# Altium integrated library Backend.IntLib: 80 symbols
Pins are listed as number, name and electrical type; pins without a type are passive.

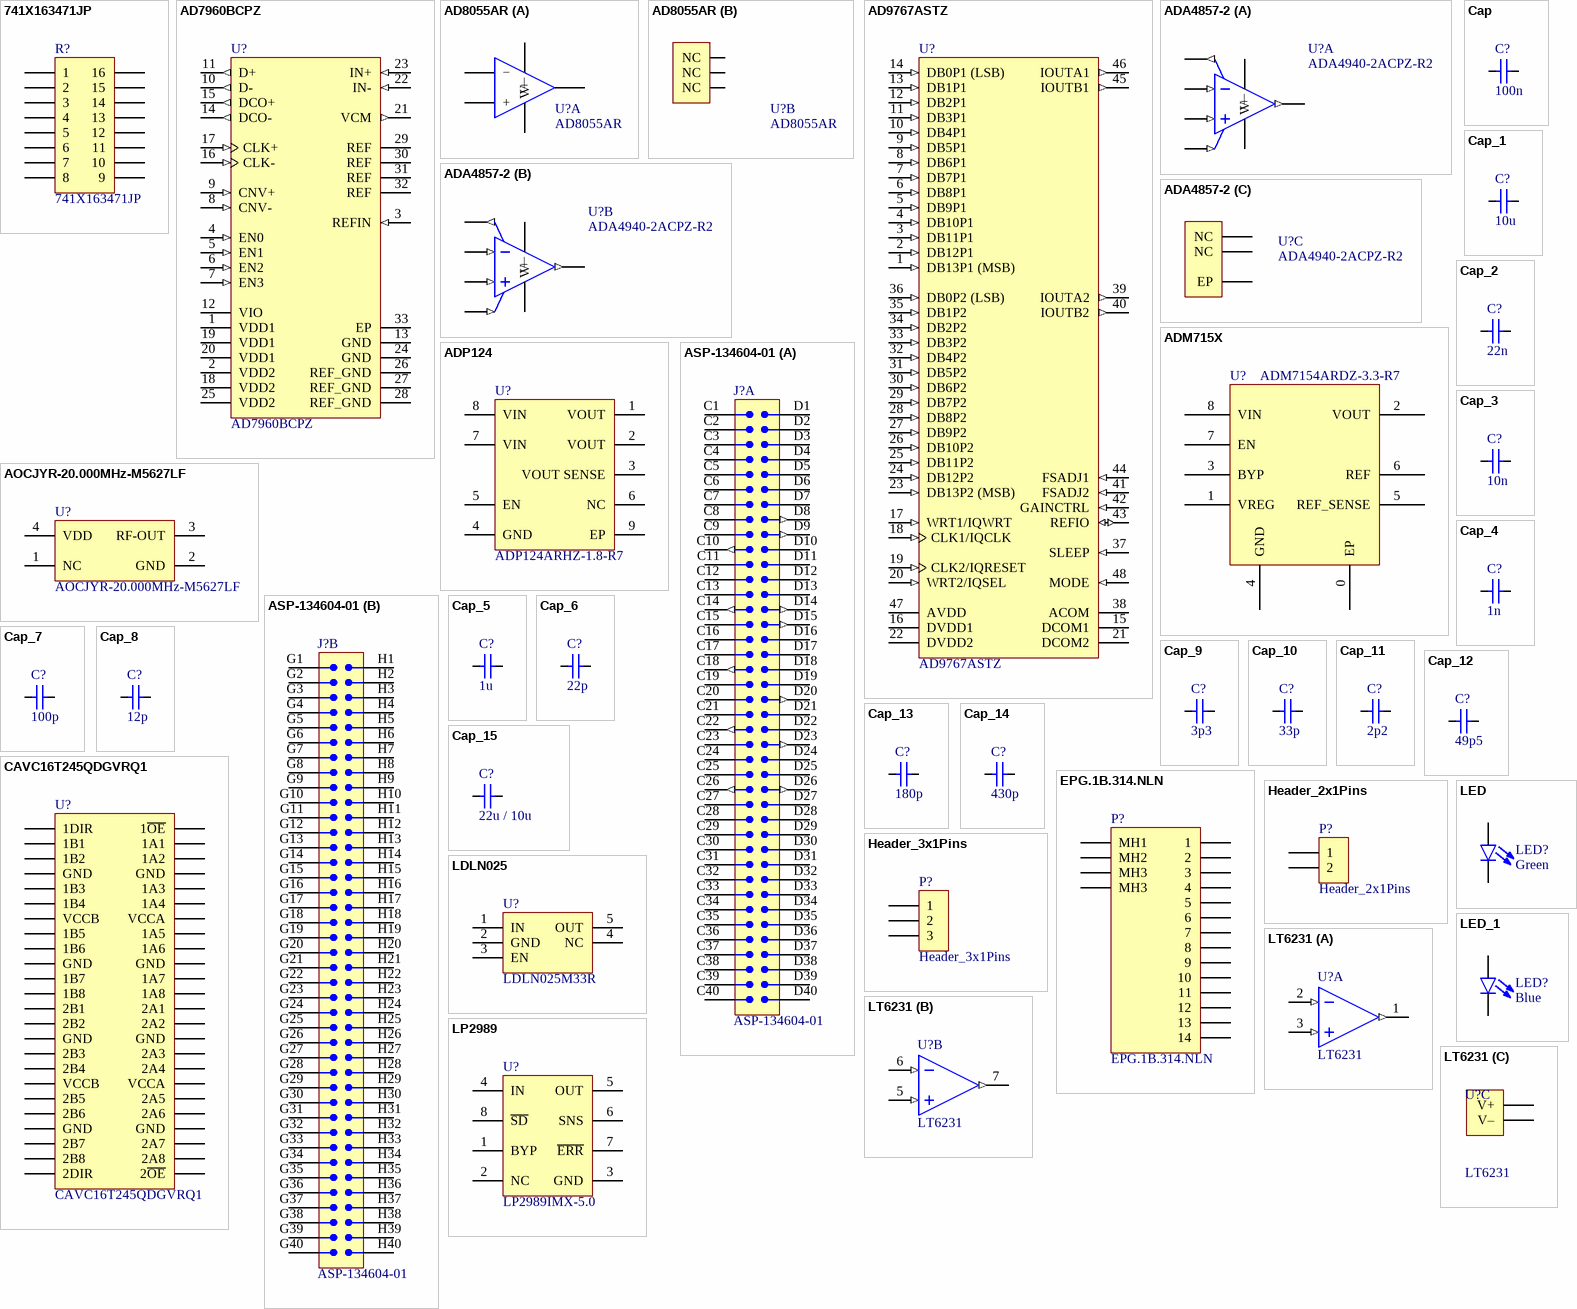
[diagram p0: symbols 741X163471JP to LT6231]

## 741X163471JP
designator R?
470 Ohm +/-5% 63mW Power Per Element Isolated 8 Resistor Network/Array +/-200ppm/C 1506, Convex, Long Side Terminals; Manufacturer_Name: CTS; Geometry.Height: 0.55mm; Mouser Part Number: *; Mouser Price/Stock: *; Manufacturer_Part_Number: 741X163471JP; Datasheet Link: https://www.ctscorp.com/wp-content/uploads/74x.pdf
footprint 741X163471JP
pins: 1, 2, 3, 4, 5, 6, 7, 8, 9, 10, 11, 12, 13, 14, 15, 16

## AD7960BCPZ
designator U?
Single 18-Bit PulSAR Differential Analog-to-Digital Converter with Serial LVDS Interface, 5 MSPS, -40 to 85 degC, CP-32-7, RoHS, Tray; Manufacturer: Analog Devices; Full Power BW: 28 MHz; # of Channels: 1; Throughput Rate: 5 MSPS; Dynamic Range: 100 dB; Resolution: 18 Bits; ComponentLink1Description: Manufacturer URL; ComponentLink3Description: Package Specification; PartNumber: AD7960BCPZ; ComponentLink1URL: http://www.analog.com/en/index.html; ComponentLink2URL: http://www.analog.com/static/imported-files/data_sheets/AD7960.pdf; ComponentLink3URL: http://www.analog.com/static/imported-files/packages/CP_32_7.pdf; RoHS: TRUE; DatasheetVersion: Rev. A; ADC_Sample_Rate: 5 MSPS; Mounting Technology: Surface Mount; Packing: Tray; PackageReference: CP-32-7; Temperature Range: -40 to 85 degC; ComponentLink2Description: Datasheet; PackageDescription: 32-Pin Lead Frame Chip Scale Package, Body 5 x 5 mm, Pitch 0.5 mm; PackageVersion: 112408-A
footprint ADI-CP-32-7_M (QFN, 32-Leads, Body 5x5mm, Pitch 0.5mm, Thermal Pad 3.1x3.1mm, IPC Low Density)
footprint ADI-CP-32-7_N (QFN, 32-Leads, Body 5x5mm, Pitch 0.5mm, Thermal Pad 3.1x3.1mm, IPC Medium Density)
footprint ADI-CP-32-7_L (QFN, 32-Leads, Body 5x5mm, Pitch 0.5mm, Thermal Pad 3.1x3.1mm, IPC High Density)
pins: 1 VDD1 (power) "Analog 5 V Supply. Decouple the 5 V supply with a 100 nF capacitor.", 2 VDD2 (power) "Analog 1.8 V Supply. Decouple this pin with a 100 nF capacitor.", 3 REFIN (in) "Prebuffer Reference Voltage.", 4 EN0 (in) "Enable.The logic levels of these pins set the operation of the device, as described in Table 9.", 5 EN1 (in) "Enable.The logic levels of these pins set the operation of the device, as described in Table 9.", 6 EN2 (in) "Enable.The logic levels of these pins set the operation of the device, as described in Table 9.", 7 EN3 (in) "Enable.The logic levels of these pins set the operation of the device, as described in Table 9.", 8 CNV- (in) "Convert Input. These pins act as the conversion control pin.", 9 CNV+ (in) "Convert Input. These pins act as the conversion control pin.", 10 D- (out) "LVDS Data Outputs. The conversion data is output serially on these pins.", 11 D+ (out) "LVDS Data Outputs. The conversion data is output serially on these pins.", 12 VIO (power) "Input/Output Interface Supply. Use a 1.8 V supply and decouple this pin with a 100 nF capacitor", 13 GND (power) "Ground.", 14 DCO- (out) "LVDS Buffered Clock Outputs.", 15 DCO+ (out) "LVDS Buffered Clock Outputs.", 16 CLK- (in) "LVDS Clock Inputs. This clock shifts out the conversion results on the falling edge of CLK+.", 17 CLK+ (in) "LVDS Clock Inputs. This clock shifts out the conversion results on the falling edge of CLK+.", 18 VDD2 (power) "Analog 1.8 V Supply. Decouple this pin with a 100 nF capacitor.", 19 VDD1 (power) "Analog 5 V Supply. Decouple the 5 V supply with a 100 nF capacitor.", 20 VDD1 (power) "Analog 5 V Supply. Decouple the 5 V supply with a 100 nF capacitor.", 21 VCM (out) "Common-Mode Output. When using any reference scheme, this pin produces one-half the voltage present on the REF pin, which can be useful for driving the common mode of the input amplifiers.", 22 IN- (in) "Differential Negative Analog Input. Referenced to and must be driven 180degC out of phase with IN+.", 23 IN+ (in) "Differential Positive Analog Input. Referenced to and must be driven 180degC out of phase with IN-.", 24 GND (power) "Ground.", 25 VDD2 (power) "Analog 1.8 V Supply. Decouple this pin with a 100 nF capacitor.", 26 REF_GND (power) "Reference Ground. Connect the capacitors on the REF pin between REF and REF_GND. Tie REF_GND to GND.", 27 REF_GND (power) "Reference Ground. Connect the capacitors on the REF pin between REF and REF_GND. Tie REF_GND to GND.", 28 REF_GND (power) "Reference Ground. Connect the capacitors on the REF pin between REF and REF_GND. Tie REF_GND to GND.", 29 REF (power) "Buffered Reference Voltage.", 30 REF (power) "Buffered Reference Voltage.", 31 REF (power) "Buffered Reference Voltage.", 32 REF (power) "Buffered Reference Voltage.", 33 EP (power) ""Exposed Pad. The exposed pad is located on the underside of the package. Connect the exposed pad"

## AD8055AR
designator U?
footprint TSOP65P490X110_HS-9N (TSOP, 8-Leads, Body 3,00x3,00mm, Pitch 0,65mm, Thermal Pad 2,00x2,00mm, IPC Medium Density)
part A pins: 2 −, 3 +, 4 V−, 6, 7 V+
part B pins: 1 NC, 5 NC, 8 NC

## AD9767ASTZ
designator U?
Dual 14-Bit TxDAC+, 125 Msps, -40 to +85 degC, ST-48, Pb-Free, Tray; Generic Part Number: AD9767; Manufacturer: Analog Devices; Single Supply: Yes; Resolution (Bits): 14; Settling Time: 35ns; Max V+: 5.5V; Op Pwr Diss: 450mW; # DAC Outputs: 2; ComponentLink2Description: Datasheet; ComponentLink2URL: http://www.analog.com/static/imported-files/data_sheets/AD9763_9765_9767.pdf; ComponentLink4URL: http://www.analog.com/en/digital-to-analog-converters/da-converters/ad9767/products/product.html; ComponentLink4Description: Product URL; Packing: Tray; DatasheetVersion: Rev.G; PackageReference: ST-48; RoHS: Y; ComponentLink3URL: http://www.analog.com/static/imported-files/packages/PKG_PDF/LQFP%28ST%29/ST_48.pdf; ComponentLink1URL: http://www.analog.com/en/index.html; RevisionNote: Component URL fixed; PartNumber: AD9767ASTZ; Mounting Technology: Surface Mount; PackageVersion: revA; ComponentLink1Description: Manufacturer URL; PackageDescription: 48-Pin Thin Quad Flat Pack 0.5 mm Pitch; ComponentLink3Description: Package Specification
footprint TQFP-48_H (Thin QFP, 48-Leads, Body 7x7mm, Pitch 0.5mm, IPC High Density)
footprint TQFP-48_M (Thin QFP, 48-Leads, Body 7x7mm, Pitch 0.5mm, IPC Medium Density)
footprint TQFP-48_L (Thin QFP, 48-Leads, Body 7x7mm, Pitch 0.5mm, IPC Low Density)
pins: 1 DB13P1 (MSB) (in) "Data Bit Pin (Port 1)", 2 DB12P1 (in) "Data Bit Pin (Port 1)", 3 DB11P1 (in) "Data Bit Pin (Port 1)", 4 DB10P1 (in) "Data Bit Pin (Port 1)", 5 DB9P1 (in) "Data Bit Pin (Port 1)", 6 DB8P1 (in) "Data Bit Pin (Port 1)", 7 DB7P1 (in) "Data Bit Pin (Port 1)", 8 DB6P1 (in) "Data Bit Pin (Port 1)", 9 DB5P1 (in) "Data Bit Pin (Port 1)", 10 DB4P1 (in) "Data Bit Pin (Port 1)", 11 DB3P1 (in) "Data Bit Pin (Port 1)", 12 DB2P1 (in) "Data Bit Pin (Port 1)", 13 DB1P1 (in) "Data Bit Pin (Port 1)", 14 DB0P1 (LSB) (in) "Data Bit Pin (Port 1)", 15 DCOM1 (power) "Digital Common", 16 DVDD1 (power) "Digital Supply Voltage", 17 WRT1/IQWRT (in) "Input Write Signal for PORT 1 (IQWRT in Interleaving Mode)", 18 CLK1/IQCLK (in) "Clock Input for DAC1 (IQCLK in Interleaving Mode)", 19 CLK2/IQRESET (in) "Clock Input for DAC2 (IQRESET in Interleaving Mode)", 20 WRT2/IQSEL (in) "Input Write Signal for PORT 2 (IQSEL in Interleaving Mode)", 21 DCOM2 (power) "Digital Common", 22 DVDD2 (power) "Digital Supply Voltage", 23 DB13P2 (MSB) (in) "Data Bit Pin (Port 2)", 24 DB12P2 (in) "Data Bit Pin (Port 2)", 25 DB11P2 (in) "Data Bit Pin (Port 2)", 26 DB10P2 (in) "Data Bit Pin (Port 2)", 27 DB9P2 (in) "Data Bit Pin (Port 2)", 28 DB8P2 (in) "Data Bit Pin (Port 2)", 29 DB7P2 (in) "Data Bit Pin (Port 2)", 30 DB6P2 (in) "Data Bit Pin (Port 2)", 31 DB5P2 (in) "Data Bit Pin (Port 2)", 32 DB4P2 (in) "Data Bit Pin (Port 2)", 33 DB3P2 (in) "Data Bit Pin (Port 2)", 34 DB2P2 (in) "Data Bit Pin (Port 2)", 35 DB1P2 (in) "Data Bit Pin (Port 2)", 36 DB0P2 (LSB) (in) "Data Bit Pin (Port 2)", 37 SLEEP (in) "Power-Down Control Input", 38 ACOM (power) "Analog Common", 39 IOUTA2 (out) "Port 2 Differential DAC Current Output", 40 IOUTB2 (out) "Port 2 Differential DAC Current Output", 41 FSADJ2 (in) "Full-Scale Current Output Adjust for DAC2", 42 GAINCTRL (in) "Master/Slave Resistor Control Mode", 43 REFIO (io) "Reference Input/Output", 44 FSADJ1 (in) "Full-Scale Current Output Adjust for DAC1", 45 IOUTB1 (out) "Port 1 Differential DAC Current Output", 46 IOUTA1 (out) "Port 1 Differential DAC Current Output", 47 AVDD (power) "Analog Supply Voltage", 48 MODE (in) "Mode Select (1 = dual port, 0 = interleaved)"

## ADA4857-2
designator U?, comment ADA4940-2ACPZ-R2
Ultralow Power, Low Distortion Fully Differential ADC Driver, 3 to 7 V, -40 to 125 degC, 16-Pin LFCSP_WQ (CP-24-7), RoHS, Reel; Manufacturer: Analog Devices; Iq/Amp: 1.25 mA Typ.; Slew Rate: 95 V/us Typ.; Test Frequency: 0.05 MHz; -3dB Bandwidth: 260 MHz Typ.; Operating Range: 3 to 7 V; ComponentLink3Description: Package Specification; ComponentLink2Description: Datasheet; RoHS: TRUE; ComponentLink2URL: http://www.analog.com/static/imported-files/data_sheets/ADA4940-1_4940-2.pdf; PackageVersion: Apr-12; DatasheetVersion: Rev. C; PackageDescription: 24-Pin Lead Frame Chip Scale Package, Body 4 x 4 mm, Pitch 0.5 mm; ComponentLink1Description: Manufacturer URL; ComponentLink1URL: http://www.analog.com/en/index.html; Packing: Reel; ComponentLink3URL: http://www.analog.com/static/imported-files/packages/PKG_PDF/LFCSP(CP)/CP_24_7.pdf; Temperature Range: -40 to 125 degC; PartNumber: ADA4940-2ACPZ-R2; Mounting Technology: Surface Mount; PartId: 1; Supplier 1: Farnell; Supplier Part Number 1: 2070673
footprint QFN65P400X400X80_HS-17N (QFN, 16-Leads, Body 4,00x4,00mm, Pitch 0,65mm, Thermal Pad 2,10x2,10mm, IPC Medium Density)
part A pins: 1 IN1- (in) "Negative Input Summing Node 1.", 2 IN1+ (in) "Positive Input Summing Node 1.", 12 V− "Negative supply 1", 13 OUT1 (out) "Output 1.", 14 V+ "Positive Supply 1", 15 PD1 (in) "Power Down Pin 1", 16 FB1 (out) "Feedback Pin 1"
part B pins: 4 V− "Negative supply 2", 5 OUT2 (out) "Output 1.", 6 V+ "Positive Supply 2", 7 PD1 (in) "Power Down Pin 2", 8 FB2 (out) "Feedback Pin 2", 9 IN1- (in) "Negative Input Summing Node 2", 10 IN1+ (in) "Positive Input Summing Node 2"
part C pins: 3 NC (power) "Output Common-Mode Voltage 1.", 11 NC (power) "Output Common-Mode Voltage 2", 17 EP (power) "Output Common-Mode Voltage 2"

## ADM715X
designator U?, comment ADM7154ARDZ-3.3-R7
footprint QFN-8Pin_TP_3mm (QFN, 8-Leads, Body 3,00x3,00mm, Pitch 0,50mm, Thermal Pad 1,60x2,44mm, IPC Medium Density)
footprint SOIC-8_TP (SOIC, 8-Leads, Body 4,90x3,90mm, Pitch 1,27mm, Thermal Pad 2,30x2,30mm, IPC Medium Density)
pins: 0 EP, 1 VREG, 2 VOUT, 3 BYP, 4 GND, 5 REF_SENSE, 6 REF, 7 EN, 8 VIN

## ADP124
designator U?, comment ADP124ARHZ-1.8-R7
footprint TSOP65P490X94_HS-9N (TSOP, 8-Leads, Body 3,00x3,00mm, Pitch 0,65mm, Thermal Pad 1,83x1,83mm, IPC Medium Density)
pins: 1 VOUT, 2 VOUT, 3 VOUT SENSE, 4 GND, 5 EN, 6 NC, 7 VIN, 8 VIN, 9 EP

## AOCJYR-20.000MHz-M5627LF
designator U?
footprint AOCJYR20000MHZM5627LFT
pins: 1 NC, 2 GND, 3 RF-OUT, 4 VDD

## ASP-134604-01
designator J?
Board to Board & Mezzanine Connectors "ASP"
footprint ASP13460401 (Board to Board & Mezzanine Connectors "ASP")
part A pins: C1 (power), C2, C3, C4 (power), C5 (power), C6, C7, C8 (power), C9 (power), C10 (out), C11, C12 (power), C13 (power), C14 (out), C15, C16 (power), C17 (power), C18 (out), C19, C20 (power), C21 (power), C22 (out), C23, C24 (power), C25 (power), C26 (out), C27, C28 (power), C29 (power), C30, C31, C32 (power), C33 (power), C34, C35 (power), C36 (power), C37 (power), C38 (power), C39 (power), C40 (power), D1, D2 (power), D3 (power), D4, D5, D6 (power), D7 (power), D8 (out), D9 (out), D10 (power), D11, D12, D13 (power), D14 (out), D15 (out), D16 (power), D17, D18, D19, D20 (out), D21, D22 (power), D23 (out), D24, D25 (power), D26 (out), D27, D28 (power), D29, D30, D31, D32 (power), D33, D34, D35, D36 (power), D37 (power), D38 (power), D39 (power), D40 (power)
part B pins: G1, G2, G3, G4, G5, G6, G7, G8, G9, G10, G11, G12, G13, G14, G15, G16, G17, G18, G19, G20, G21, G22, G23, G24, G25, G26, G27, G28, G29, G30, G31, G32, G33, G34, G35, G36, G37, G38, G39, G40, H1, H2, H3, H4, H5, H6, H7, H8, H9, H10, H11, H12, H13, H14, H15, H16, H17, H18, H19, H20, H21, H22, H23, H24, H25, H26, H27, H28, H29, H30, H31, H32, H33, H34, H35, H36, H37, H38, H39, H40

## Cap
designator C?, comment 100n
Supplier: *; Part Number: *; Value: 100n
footprint CAP_0402 (Chip Capacitor, 2-Leads, Body 1,00x0,50mm, IPC Medium Density)
footprint CAP_0603 (Chip Capacitor, 2-Leads, Body 1,60x0,80mm, IPC Medium Density)
footprint CAP_0805 (Chip Capacitor, 2-Leads, Body 2,00x1,25mm, IPC Medium Density)
footprint CAP_1206 (Chip Capacitor, 2-Leads, Body 3,20x1,60mm, IPC Medium Density)
pins: 1, 2

## Cap_1
designator C?, comment 10u
Supplier: *; Part Number: *; Value: 10u
footprint CAP_0402 (Chip Capacitor, 2-Leads, Body 1,00x0,50mm, IPC Medium Density)
footprint CAP_0603 (Chip Capacitor, 2-Leads, Body 1,60x0,80mm, IPC Medium Density)
footprint CAP_0805 (Chip Capacitor, 2-Leads, Body 2,00x1,25mm, IPC Medium Density)
footprint CAP_1206 (Chip Capacitor, 2-Leads, Body 3,20x1,60mm, IPC Medium Density)
pins: 1, 2

## Cap_2
designator C?, comment 22n
Supplier: *; Part Number: *; Value: 22n
footprint CAP_0402 (Chip Capacitor, 2-Leads, Body 1,00x0,50mm, IPC Medium Density)
footprint CAP_0603 (Chip Capacitor, 2-Leads, Body 1,60x0,80mm, IPC Medium Density)
footprint CAP_0805 (Chip Capacitor, 2-Leads, Body 2,00x1,25mm, IPC Medium Density)
footprint CAP_1206 (Chip Capacitor, 2-Leads, Body 3,20x1,60mm, IPC Medium Density)
pins: 1, 2

## Cap_3
designator C?, comment 10n
Supplier: *; Part Number: *; Value: 10n
footprint CAP_0402 (Chip Capacitor, 2-Leads, Body 1,00x0,50mm, IPC Medium Density)
footprint CAP_0603 (Chip Capacitor, 2-Leads, Body 1,60x0,80mm, IPC Medium Density)
footprint CAP_0805 (Chip Capacitor, 2-Leads, Body 2,00x1,25mm, IPC Medium Density)
footprint CAP_1206 (Chip Capacitor, 2-Leads, Body 3,20x1,60mm, IPC Medium Density)
pins: 1, 2

## Cap_4
designator C?, comment 1n
Supplier: *; Part Number: *; Value: 1n
footprint CAP_0402 (Chip Capacitor, 2-Leads, Body 1,00x0,50mm, IPC Medium Density)
footprint CAP_0603 (Chip Capacitor, 2-Leads, Body 1,60x0,80mm, IPC Medium Density)
footprint CAP_0805 (Chip Capacitor, 2-Leads, Body 2,00x1,25mm, IPC Medium Density)
footprint CAP_1206 (Chip Capacitor, 2-Leads, Body 3,20x1,60mm, IPC Medium Density)
pins: 1, 2

## Cap_5
designator C?, comment 1u
Supplier: *; Part Number: *; Value: 1u
footprint CAP_0402 (Chip Capacitor, 2-Leads, Body 1,00x0,50mm, IPC Medium Density)
footprint CAP_0603 (Chip Capacitor, 2-Leads, Body 1,60x0,80mm, IPC Medium Density)
footprint CAP_0805 (Chip Capacitor, 2-Leads, Body 2,00x1,25mm, IPC Medium Density)
footprint CAP_1206 (Chip Capacitor, 2-Leads, Body 3,20x1,60mm, IPC Medium Density)
pins: 1, 2

## Cap_6
designator C?, comment 22p
Supplier: *; Part Number: *; Value: 22p
footprint CAP_0402 (Chip Capacitor, 2-Leads, Body 1,00x0,50mm, IPC Medium Density)
footprint CAP_0603 (Chip Capacitor, 2-Leads, Body 1,60x0,80mm, IPC Medium Density)
footprint CAP_0805 (Chip Capacitor, 2-Leads, Body 2,00x1,25mm, IPC Medium Density)
footprint CAP_1206 (Chip Capacitor, 2-Leads, Body 3,20x1,60mm, IPC Medium Density)
pins: 1, 2

## Cap_7
designator C?, comment 100p
Supplier: *; Part Number: *; Value: 100p
footprint CAP_0402 (Chip Capacitor, 2-Leads, Body 1,00x0,50mm, IPC Medium Density)
footprint CAP_0603 (Chip Capacitor, 2-Leads, Body 1,60x0,80mm, IPC Medium Density)
footprint CAP_0805 (Chip Capacitor, 2-Leads, Body 2,00x1,25mm, IPC Medium Density)
footprint CAP_1206 (Chip Capacitor, 2-Leads, Body 3,20x1,60mm, IPC Medium Density)
pins: 1, 2

## Cap_8
designator C?, comment 12p
Supplier: *; Part Number: *; Value: 12p
footprint CAP_0402 (Chip Capacitor, 2-Leads, Body 1,00x0,50mm, IPC Medium Density)
footprint CAP_0603 (Chip Capacitor, 2-Leads, Body 1,60x0,80mm, IPC Medium Density)
footprint CAP_0805 (Chip Capacitor, 2-Leads, Body 2,00x1,25mm, IPC Medium Density)
footprint CAP_1206 (Chip Capacitor, 2-Leads, Body 3,20x1,60mm, IPC Medium Density)
pins: 1, 2

## Cap_9
designator C?, comment 3p3
Supplier: *; Part Number: *; Value: 3p3
footprint CAP_0402 (Chip Capacitor, 2-Leads, Body 1,00x0,50mm, IPC Medium Density)
footprint CAP_0603 (Chip Capacitor, 2-Leads, Body 1,60x0,80mm, IPC Medium Density)
footprint CAP_0805 (Chip Capacitor, 2-Leads, Body 2,00x1,25mm, IPC Medium Density)
footprint CAP_1206 (Chip Capacitor, 2-Leads, Body 3,20x1,60mm, IPC Medium Density)
pins: 1, 2

## Cap_10
designator C?, comment 33p
Supplier: *; Part Number: *; Value: 33p
footprint CAP_0402 (Chip Capacitor, 2-Leads, Body 1,00x0,50mm, IPC Medium Density)
footprint CAP_0603 (Chip Capacitor, 2-Leads, Body 1,60x0,80mm, IPC Medium Density)
footprint CAP_0805 (Chip Capacitor, 2-Leads, Body 2,00x1,25mm, IPC Medium Density)
footprint CAP_1206 (Chip Capacitor, 2-Leads, Body 3,20x1,60mm, IPC Medium Density)
pins: 1, 2

## Cap_11
designator C?, comment 2p2
Supplier: *; Part Number: *; Value: 2p2
footprint CAP_0402 (Chip Capacitor, 2-Leads, Body 1,00x0,50mm, IPC Medium Density)
footprint CAP_0603 (Chip Capacitor, 2-Leads, Body 1,60x0,80mm, IPC Medium Density)
footprint CAP_0805 (Chip Capacitor, 2-Leads, Body 2,00x1,25mm, IPC Medium Density)
footprint CAP_1206 (Chip Capacitor, 2-Leads, Body 3,20x1,60mm, IPC Medium Density)
pins: 1, 2

## Cap_12
designator C?, comment 49p5
Supplier: *; Part Number: *; Value: 49p5
footprint CAP_0402 (Chip Capacitor, 2-Leads, Body 1,00x0,50mm, IPC Medium Density)
footprint CAP_0603 (Chip Capacitor, 2-Leads, Body 1,60x0,80mm, IPC Medium Density)
footprint CAP_0805 (Chip Capacitor, 2-Leads, Body 2,00x1,25mm, IPC Medium Density)
footprint CAP_1206 (Chip Capacitor, 2-Leads, Body 3,20x1,60mm, IPC Medium Density)
pins: 1, 2

## Cap_13
designator C?, comment 180p
Supplier: *; Part Number: *; Value: 180p
footprint CAP_0402 (Chip Capacitor, 2-Leads, Body 1,00x0,50mm, IPC Medium Density)
footprint CAP_0603 (Chip Capacitor, 2-Leads, Body 1,60x0,80mm, IPC Medium Density)
footprint CAP_0805 (Chip Capacitor, 2-Leads, Body 2,00x1,25mm, IPC Medium Density)
footprint CAP_1206 (Chip Capacitor, 2-Leads, Body 3,20x1,60mm, IPC Medium Density)
pins: 1, 2

## Cap_14
designator C?, comment 430p
Supplier: *; Part Number: *; Value: 430p
footprint CAP_0402 (Chip Capacitor, 2-Leads, Body 1,00x0,50mm, IPC Medium Density)
footprint CAP_0603 (Chip Capacitor, 2-Leads, Body 1,60x0,80mm, IPC Medium Density)
footprint CAP_0805 (Chip Capacitor, 2-Leads, Body 2,00x1,25mm, IPC Medium Density)
footprint CAP_1206 (Chip Capacitor, 2-Leads, Body 3,20x1,60mm, IPC Medium Density)
pins: 1, 2

## Cap_15
designator C?, comment 22u / 10u
Supplier: *; Part Number: *; Value: 22u / 10u
footprint CAP_0402 (Chip Capacitor, 2-Leads, Body 1,00x0,50mm, IPC Medium Density)
footprint CAP_0603 (Chip Capacitor, 2-Leads, Body 1,60x0,80mm, IPC Medium Density)
footprint CAP_0805 (Chip Capacitor, 2-Leads, Body 2,00x1,25mm, IPC Medium Density)
footprint CAP_1206 (Chip Capacitor, 2-Leads, Body 3,20x1,60mm, IPC Medium Density)
pins: 1, 2

## CAVC16T245QDGVRQ1
designator U?
16-Bit Dual-Supply Bus Transceiver With Configurable Voltage Translation and 3-State Outputs
footprint TSSOP40P640X120-48N (TSSOP, 48-Leads, Body 9,70x4,40mm, Pitch 0,40mm, IPC Medium Density)
pins: 1 1DIR, 2 1B1, 3 1B2, 4 GND, 5 1B3, 6 1B4, 7 VCCB, 8 1B5, 9 1B6, 10 GND, 11 1B7, 12 1B8, 13 2B1, 14 2B2, 15 GND, 16 2B3, 17 2B4, 18 VCCB, 19 2B5, 20 2B6, 21 GND, 22 2B7, 23 2B8, 24 2DIR, 25 2~{OE}, 26 2A8, 27 2A7, 28 GND, 29 2A6, 30 2A5, 31 VCCA, 32 2A4, 33 2A3, 34 GND, 35 2A2, 36 2A1, 37 1A8, 38 1A7, 39 GND, 40 1A6, 41 1A5, 42 VCCA, 43 1A4, 44 1A3, 45 GND, 46 1A2, 47 1A1, 48 1~{OE}

## EPG.1B.314.NLN
designator P?
LEMO Connector - 14 pin EPG.1B.314.NLN Elbow receptacle for printed circuit (solder mount), Female Contact Drawing Rev. 00 Source: http://www.lemo.com/catalog/ROW/UK_English/unipole_multipole.pdf
footprint EPG.1B.314.NLN
pins: 1, 2, 3, 4, 5, 6, 7, 8, 9, 10, 11, 12, 13, 14, 15 MH1, 16 MH2, 17 MH3, 18 MH3

## Header_2x1Pins
designator P?
footprint Header_2x1pins
pins: 1, 2

## Header_3x1Pins
designator P?
footprint Header_3x1Pins (Pin Header, pitch 2.54 mm, THT, Vertical, single row, 3p)
pins: 1, 2, 3

## LDLN025
designator U?, comment LDLN025M33R
footprint SOT95P280X145-5N (SOT23, 5-Leads, Body 2,95x2,80mm, Pitch 0,95mm, IPC Medium Density)
pins: 1 IN, 2 GND, 3 EN, 4 NC, 5 OUT

## LED
designator LED?, comment Green
footprint PLCC-2 (LED)
footprint LED_THT_2.54
footprint RES_0603 (Chip Resistor, 2-Leads, Body 1,60x0,83mm, IPC Medium Density)
pins: 1, 2

## LED_1
designator LED?, comment Blue
footprint PLCC-2 (LED)
footprint LED_THT_2.54
footprint RES_0603 (Chip Resistor, 2-Leads, Body 1,60x0,83mm, IPC Medium Density)
pins: 1, 2

## LP2989
designator U?, comment LP2989IMX-5.0
footprint TSOP65P490X110-8N (TSOP, 8-Leads, Body 3,00x3,00mm, Pitch 0,65mm, IPC Medium Density)
footprint SOP127P600X175-8N (SOP, 8-Leads, Body 4,90x3,90mm, Pitch 1,27mm, IPC Medium Density)
pins: 1 BYP, 2 NC, 3 GND, 4 IN, 5 OUT, 6 SNS, 7 ~{ERR}, 8 ~{SD}

## LT6231
designator U?
215MHz, Rail-to-Rail Output, 1.1nV/√Hz, 3.5mA Op Amp Family
footprint SOP127P600X175-8N (SOP, 8-Leads, Body 4,90x3,90mm, Pitch 1,27mm, IPC Medium Density)
part A pins: 1 OUT1 (out) "Output 1", 2 IN1- (in) "Negative Input Summing Node 1", 3 IN1+ (in) "Positive Input Summing Node 1"
part B pins: 5 IN1+ (in) "Positive Input Summing Node 2", 6 IN1- (in) "Negative Input Summing Node 2", 7 OUT2 (out) "Output 1."
part C pins: 4 V– (power) "Output Common-Mode Voltage 2", 8 V+ (power) "Output Common-Mode Voltage 1."

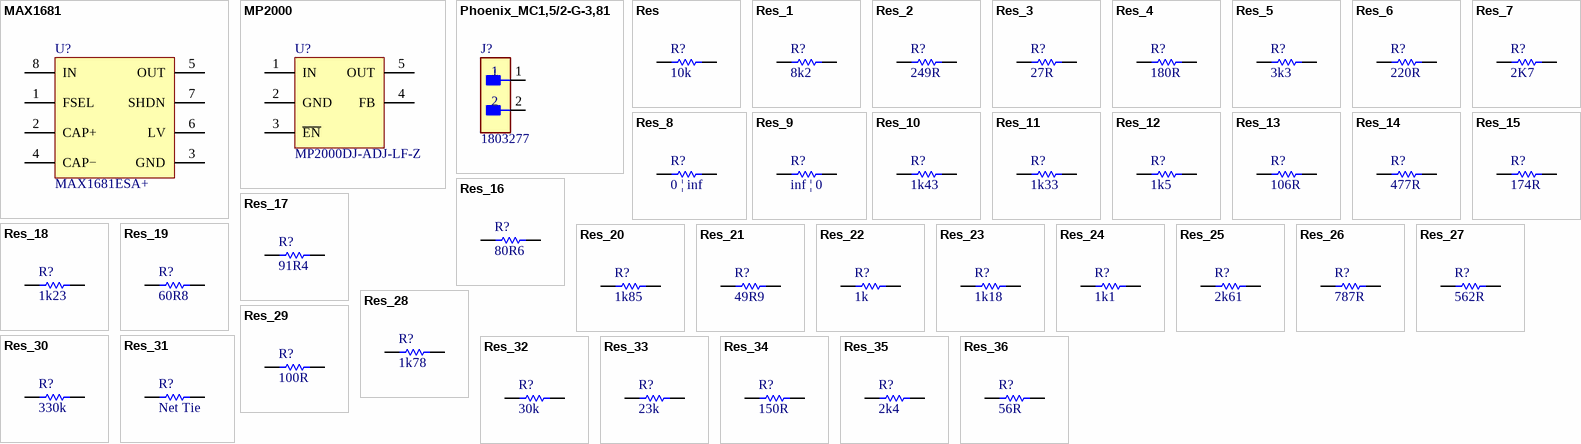
[diagram p1: symbols MAX1681 to Res_36]

## MAX1681
designator U?, comment MAX1681ESA+
125mA, Frequency-Selectable, Switched-Capacitor Voltage Converters
footprint SOP127P600X175-8N (SOP, 8-Leads, Body 4,90x3,90mm, Pitch 1,27mm, IPC Medium Density)
pins: 1 FSEL, 2 CAP+, 3 GND, 4 CAP−, 5 OUT, 6 LV, 7 SHDN, 8 IN

## MP2000
designator U?, comment MP2000DJ-ADJ-LF-Z
footprint SOT95P280X145-5N (SOT23, 5-Leads, Body 2,95x2,80mm, Pitch 0,95mm, IPC Medium Density)
pins: 1 IN, 2 GND, 3 ~{EN}, 4 FB, 5 OUT

## Phoenix_MC1,5/2-G-3,81
designator J?, comment 1803277
Manufacturer: Phoenix Contact; Manufacturer Name: MC 1,5/ 2-G-3,81; Manufacturer P/N: 1803277
footprint Phoenix_MC1,5/2-G-3,81
pins: 1, 2

## Res
designator R?, comment 10k
Part Number: *; Supplier: *; Value: 10k
footprint RES_0402 (Chip Resistor, 2-Leads, Body 1,05x0,54mm, IPC Medium Density)
footprint RES_0603 (Chip Resistor, 2-Leads, Body 1,60x0,83mm, IPC Medium Density)
footprint RES_0805 (Chip Resistor, 2-Leads, Body 2,00x1,25mm, IPC Medium Density)
pins: 1, 2

## Res_1
designator R?, comment 8k2
Part Number: *; Supplier: *; Value: 8k2
footprint RES_0402 (Chip Resistor, 2-Leads, Body 1,05x0,54mm, IPC Medium Density)
footprint RES_0603 (Chip Resistor, 2-Leads, Body 1,60x0,83mm, IPC Medium Density)
footprint RES_0805 (Chip Resistor, 2-Leads, Body 2,00x1,25mm, IPC Medium Density)
pins: 1, 2

## Res_2
designator R?, comment 249R
Part Number: *; Supplier: *; Value: 249R
footprint RES_0402 (Chip Resistor, 2-Leads, Body 1,05x0,54mm, IPC Medium Density)
footprint RES_0603 (Chip Resistor, 2-Leads, Body 1,60x0,83mm, IPC Medium Density)
footprint RES_0805 (Chip Resistor, 2-Leads, Body 2,00x1,25mm, IPC Medium Density)
pins: 1, 2

## Res_3
designator R?, comment 27R
Part Number: *; Supplier: *; Value: 27R
footprint RES_0402 (Chip Resistor, 2-Leads, Body 1,05x0,54mm, IPC Medium Density)
footprint RES_0603 (Chip Resistor, 2-Leads, Body 1,60x0,83mm, IPC Medium Density)
footprint RES_0805 (Chip Resistor, 2-Leads, Body 2,00x1,25mm, IPC Medium Density)
pins: 1, 2

## Res_4
designator R?, comment 180R
Part Number: *; Supplier: *; Value: 180R
footprint RES_0402 (Chip Resistor, 2-Leads, Body 1,05x0,54mm, IPC Medium Density)
footprint RES_0603 (Chip Resistor, 2-Leads, Body 1,60x0,83mm, IPC Medium Density)
footprint RES_0805 (Chip Resistor, 2-Leads, Body 2,00x1,25mm, IPC Medium Density)
pins: 1, 2

## Res_5
designator R?, comment 3k3
Part Number: *; Supplier: *; Value: 3k3
footprint RES_0402 (Chip Resistor, 2-Leads, Body 1,05x0,54mm, IPC Medium Density)
footprint RES_0603 (Chip Resistor, 2-Leads, Body 1,60x0,83mm, IPC Medium Density)
footprint RES_0805 (Chip Resistor, 2-Leads, Body 2,00x1,25mm, IPC Medium Density)
pins: 1, 2

## Res_6
designator R?, comment 220R
Part Number: *; Supplier: *; Value: 220R
footprint RES_0402 (Chip Resistor, 2-Leads, Body 1,05x0,54mm, IPC Medium Density)
footprint RES_0603 (Chip Resistor, 2-Leads, Body 1,60x0,83mm, IPC Medium Density)
footprint RES_0805 (Chip Resistor, 2-Leads, Body 2,00x1,25mm, IPC Medium Density)
pins: 1, 2

## Res_7
designator R?, comment 2K7
Part Number: *; Supplier: *; Value: 2K7
footprint RES_0402 (Chip Resistor, 2-Leads, Body 1,05x0,54mm, IPC Medium Density)
footprint RES_0603 (Chip Resistor, 2-Leads, Body 1,60x0,83mm, IPC Medium Density)
footprint RES_0805 (Chip Resistor, 2-Leads, Body 2,00x1,25mm, IPC Medium Density)
pins: 1, 2

## Res_8
designator R?, comment 0 | inf
Part Number: *; Supplier: *; Value: 0 | inf
footprint RES_0402 (Chip Resistor, 2-Leads, Body 1,05x0,54mm, IPC Medium Density)
footprint RES_0603 (Chip Resistor, 2-Leads, Body 1,60x0,83mm, IPC Medium Density)
footprint RES_0805 (Chip Resistor, 2-Leads, Body 2,00x1,25mm, IPC Medium Density)
pins: 1, 2

## Res_9
designator R?, comment inf | 0
Part Number: *; Supplier: *; Value: inf | 0
footprint RES_0402 (Chip Resistor, 2-Leads, Body 1,05x0,54mm, IPC Medium Density)
footprint RES_0603 (Chip Resistor, 2-Leads, Body 1,60x0,83mm, IPC Medium Density)
footprint RES_0805 (Chip Resistor, 2-Leads, Body 2,00x1,25mm, IPC Medium Density)
pins: 1, 2

## Res_10
designator R?, comment 1k43
Part Number: *; Supplier: *; Value: 1k43
footprint RES_0402 (Chip Resistor, 2-Leads, Body 1,05x0,54mm, IPC Medium Density)
footprint RES_0603 (Chip Resistor, 2-Leads, Body 1,60x0,83mm, IPC Medium Density)
footprint RES_0805 (Chip Resistor, 2-Leads, Body 2,00x1,25mm, IPC Medium Density)
pins: 1, 2

## Res_11
designator R?, comment 1k33
Part Number: *; Supplier: *; Value: 1k33
footprint RES_0402 (Chip Resistor, 2-Leads, Body 1,05x0,54mm, IPC Medium Density)
footprint RES_0603 (Chip Resistor, 2-Leads, Body 1,60x0,83mm, IPC Medium Density)
footprint RES_0805 (Chip Resistor, 2-Leads, Body 2,00x1,25mm, IPC Medium Density)
pins: 1, 2

## Res_12
designator R?, comment 1k5
Part Number: *; Supplier: *; Value: 1k5
footprint RES_0402 (Chip Resistor, 2-Leads, Body 1,05x0,54mm, IPC Medium Density)
footprint RES_0603 (Chip Resistor, 2-Leads, Body 1,60x0,83mm, IPC Medium Density)
footprint RES_0805 (Chip Resistor, 2-Leads, Body 2,00x1,25mm, IPC Medium Density)
pins: 1, 2

## Res_13
designator R?, comment 106R
Part Number: *; Supplier: *; Value: 106R
footprint RES_0402 (Chip Resistor, 2-Leads, Body 1,05x0,54mm, IPC Medium Density)
footprint RES_0603 (Chip Resistor, 2-Leads, Body 1,60x0,83mm, IPC Medium Density)
footprint RES_0805 (Chip Resistor, 2-Leads, Body 2,00x1,25mm, IPC Medium Density)
pins: 1, 2

## Res_14
designator R?, comment 477R
Part Number: *; Supplier: *; Value: 477R
footprint RES_0402 (Chip Resistor, 2-Leads, Body 1,05x0,54mm, IPC Medium Density)
footprint RES_0603 (Chip Resistor, 2-Leads, Body 1,60x0,83mm, IPC Medium Density)
footprint RES_0805 (Chip Resistor, 2-Leads, Body 2,00x1,25mm, IPC Medium Density)
pins: 1, 2

## Res_15
designator R?, comment 174R
Part Number: *; Supplier: *; Value: 174R
footprint RES_0402 (Chip Resistor, 2-Leads, Body 1,05x0,54mm, IPC Medium Density)
footprint RES_0603 (Chip Resistor, 2-Leads, Body 1,60x0,83mm, IPC Medium Density)
footprint RES_0805 (Chip Resistor, 2-Leads, Body 2,00x1,25mm, IPC Medium Density)
pins: 1, 2

## Res_16
designator R?, comment 80R6
Part Number: *; Supplier: *; Value: 80R6
footprint RES_0402 (Chip Resistor, 2-Leads, Body 1,05x0,54mm, IPC Medium Density)
footprint RES_0603 (Chip Resistor, 2-Leads, Body 1,60x0,83mm, IPC Medium Density)
footprint RES_0805 (Chip Resistor, 2-Leads, Body 2,00x1,25mm, IPC Medium Density)
pins: 1, 2

## Res_17
designator R?, comment 91R4
Part Number: *; Supplier: *; Value: 91R4
footprint RES_0402 (Chip Resistor, 2-Leads, Body 1,05x0,54mm, IPC Medium Density)
footprint RES_0603 (Chip Resistor, 2-Leads, Body 1,60x0,83mm, IPC Medium Density)
footprint RES_0805 (Chip Resistor, 2-Leads, Body 2,00x1,25mm, IPC Medium Density)
pins: 1, 2

## Res_18
designator R?, comment 1k23
Part Number: *; Supplier: *; Value: 1k23
footprint RES_0402 (Chip Resistor, 2-Leads, Body 1,05x0,54mm, IPC Medium Density)
footprint RES_0603 (Chip Resistor, 2-Leads, Body 1,60x0,83mm, IPC Medium Density)
footprint RES_0805 (Chip Resistor, 2-Leads, Body 2,00x1,25mm, IPC Medium Density)
pins: 1, 2

## Res_19
designator R?, comment 60R8
Part Number: *; Supplier: *; Value: 60R8
footprint RES_0402 (Chip Resistor, 2-Leads, Body 1,05x0,54mm, IPC Medium Density)
footprint RES_0603 (Chip Resistor, 2-Leads, Body 1,60x0,83mm, IPC Medium Density)
footprint RES_0805 (Chip Resistor, 2-Leads, Body 2,00x1,25mm, IPC Medium Density)
pins: 1, 2

## Res_20
designator R?, comment 1k85
Part Number: *; Supplier: *; Value: 1k85
footprint RES_0402 (Chip Resistor, 2-Leads, Body 1,05x0,54mm, IPC Medium Density)
footprint RES_0603 (Chip Resistor, 2-Leads, Body 1,60x0,83mm, IPC Medium Density)
footprint RES_0805 (Chip Resistor, 2-Leads, Body 2,00x1,25mm, IPC Medium Density)
pins: 1, 2

## Res_21
designator R?, comment 49R9
Part Number: *; Supplier: *; Value: 49R9
footprint RES_0402 (Chip Resistor, 2-Leads, Body 1,05x0,54mm, IPC Medium Density)
footprint RES_0603 (Chip Resistor, 2-Leads, Body 1,60x0,83mm, IPC Medium Density)
footprint RES_0805 (Chip Resistor, 2-Leads, Body 2,00x1,25mm, IPC Medium Density)
pins: 1, 2

## Res_22
designator R?, comment 1k
Part Number: *; Supplier: *; Value: 1k
footprint RES_0402 (Chip Resistor, 2-Leads, Body 1,05x0,54mm, IPC Medium Density)
footprint RES_0603 (Chip Resistor, 2-Leads, Body 1,60x0,83mm, IPC Medium Density)
footprint RES_0805 (Chip Resistor, 2-Leads, Body 2,00x1,25mm, IPC Medium Density)
pins: 1, 2

## Res_23
designator R?, comment 1k18
Part Number: *; Supplier: *; Value: 1k18
footprint RES_0402 (Chip Resistor, 2-Leads, Body 1,05x0,54mm, IPC Medium Density)
footprint RES_0603 (Chip Resistor, 2-Leads, Body 1,60x0,83mm, IPC Medium Density)
footprint RES_0805 (Chip Resistor, 2-Leads, Body 2,00x1,25mm, IPC Medium Density)
pins: 1, 2

## Res_24
designator R?, comment 1k1
Part Number: *; Supplier: *; Value: 1k1
footprint RES_0402 (Chip Resistor, 2-Leads, Body 1,05x0,54mm, IPC Medium Density)
footprint RES_0603 (Chip Resistor, 2-Leads, Body 1,60x0,83mm, IPC Medium Density)
footprint RES_0805 (Chip Resistor, 2-Leads, Body 2,00x1,25mm, IPC Medium Density)
pins: 1, 2

## Res_25
designator R?, comment 2k61
Part Number: *; Supplier: *; Value: 2k61
footprint RES_0402 (Chip Resistor, 2-Leads, Body 1,05x0,54mm, IPC Medium Density)
footprint RES_0603 (Chip Resistor, 2-Leads, Body 1,60x0,83mm, IPC Medium Density)
footprint RES_0805 (Chip Resistor, 2-Leads, Body 2,00x1,25mm, IPC Medium Density)
pins: 1, 2

## Res_26
designator R?, comment 787R
Part Number: *; Supplier: *; Value: 787R
footprint RES_0402 (Chip Resistor, 2-Leads, Body 1,05x0,54mm, IPC Medium Density)
footprint RES_0603 (Chip Resistor, 2-Leads, Body 1,60x0,83mm, IPC Medium Density)
footprint RES_0805 (Chip Resistor, 2-Leads, Body 2,00x1,25mm, IPC Medium Density)
pins: 1, 2

## Res_27
designator R?, comment 562R
Part Number: *; Supplier: *; Value: 562R
footprint RES_0402 (Chip Resistor, 2-Leads, Body 1,05x0,54mm, IPC Medium Density)
footprint RES_0603 (Chip Resistor, 2-Leads, Body 1,60x0,83mm, IPC Medium Density)
footprint RES_0805 (Chip Resistor, 2-Leads, Body 2,00x1,25mm, IPC Medium Density)
pins: 1, 2

## Res_28
designator R?, comment 1k78
Part Number: *; Supplier: *; Value: 1k78
footprint RES_0402 (Chip Resistor, 2-Leads, Body 1,05x0,54mm, IPC Medium Density)
footprint RES_0603 (Chip Resistor, 2-Leads, Body 1,60x0,83mm, IPC Medium Density)
footprint RES_0805 (Chip Resistor, 2-Leads, Body 2,00x1,25mm, IPC Medium Density)
pins: 1, 2

## Res_29
designator R?, comment 100R
Part Number: *; Supplier: *; Value: 100R
footprint RES_0402 (Chip Resistor, 2-Leads, Body 1,05x0,54mm, IPC Medium Density)
footprint RES_0603 (Chip Resistor, 2-Leads, Body 1,60x0,83mm, IPC Medium Density)
footprint RES_0805 (Chip Resistor, 2-Leads, Body 2,00x1,25mm, IPC Medium Density)
pins: 1, 2

## Res_30
designator R?, comment 330k
Part Number: *; Supplier: *; Value: 330k
footprint RES_0402 (Chip Resistor, 2-Leads, Body 1,05x0,54mm, IPC Medium Density)
footprint RES_0603 (Chip Resistor, 2-Leads, Body 1,60x0,83mm, IPC Medium Density)
footprint RES_0805 (Chip Resistor, 2-Leads, Body 2,00x1,25mm, IPC Medium Density)
pins: 1, 2

## Res_31
designator R?, comment Net Tie
Value: 0R; Part Number: *; Supplier: *
footprint RES_0402 (Chip Resistor, 2-Leads, Body 1,05x0,54mm, IPC Medium Density)
footprint RES_0603 (Chip Resistor, 2-Leads, Body 1,60x0,83mm, IPC Medium Density)
footprint RES_0805 (Chip Resistor, 2-Leads, Body 2,00x1,25mm, IPC Medium Density)
pins: 1, 2

## Res_32
designator R?, comment 30k
Part Number: *; Supplier: *; Value: 30k
footprint RES_0402 (Chip Resistor, 2-Leads, Body 1,05x0,54mm, IPC Medium Density)
footprint RES_0603 (Chip Resistor, 2-Leads, Body 1,60x0,83mm, IPC Medium Density)
footprint RES_0805 (Chip Resistor, 2-Leads, Body 2,00x1,25mm, IPC Medium Density)
pins: 1, 2

## Res_33
designator R?, comment 23k
Part Number: *; Supplier: *; Value: 23k
footprint RES_0402 (Chip Resistor, 2-Leads, Body 1,05x0,54mm, IPC Medium Density)
footprint RES_0603 (Chip Resistor, 2-Leads, Body 1,60x0,83mm, IPC Medium Density)
footprint RES_0805 (Chip Resistor, 2-Leads, Body 2,00x1,25mm, IPC Medium Density)
pins: 1, 2

## Res_34
designator R?, comment 150R
Part Number: *; Supplier: *; Value: 150R
footprint RES_0402 (Chip Resistor, 2-Leads, Body 1,05x0,54mm, IPC Medium Density)
footprint RES_0603 (Chip Resistor, 2-Leads, Body 1,60x0,83mm, IPC Medium Density)
footprint RES_0805 (Chip Resistor, 2-Leads, Body 2,00x1,25mm, IPC Medium Density)
pins: 1, 2

## Res_35
designator R?, comment 2k4
Part Number: *; Supplier: *; Value: 2k4
footprint RES_0402 (Chip Resistor, 2-Leads, Body 1,05x0,54mm, IPC Medium Density)
footprint RES_0603 (Chip Resistor, 2-Leads, Body 1,60x0,83mm, IPC Medium Density)
footprint RES_0805 (Chip Resistor, 2-Leads, Body 2,00x1,25mm, IPC Medium Density)
pins: 1, 2

## Res_36
designator R?, comment 56R
Part Number: *; Supplier: *; Value: 56R
footprint RES_0402 (Chip Resistor, 2-Leads, Body 1,05x0,54mm, IPC Medium Density)
footprint RES_0603 (Chip Resistor, 2-Leads, Body 1,60x0,83mm, IPC Medium Density)
footprint RES_0805 (Chip Resistor, 2-Leads, Body 2,00x1,25mm, IPC Medium Density)
pins: 1, 2

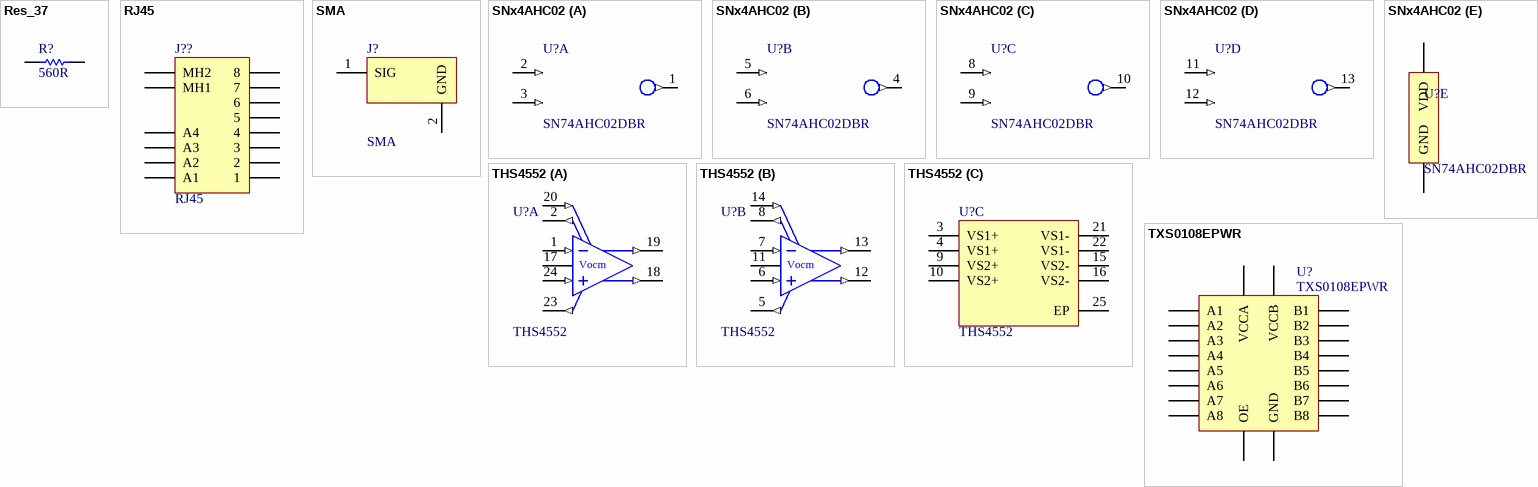
[diagram p2: symbols Res_37 to TXS0108EPWR]

## Res_37
designator R?, comment 560R
Part Number: *; Supplier: *; Value: 560R
footprint RES_0402 (Chip Resistor, 2-Leads, Body 1,05x0,54mm, IPC Medium Density)
footprint RES_0603 (Chip Resistor, 2-Leads, Body 1,60x0,83mm, IPC Medium Density)
footprint RES_0805 (Chip Resistor, 2-Leads, Body 2,00x1,25mm, IPC Medium Density)
pins: 1, 2

## RJ45
designator J??
Ethernet Connectors RJ45 SMT
footprint RJ45 - 54067213 (Ethernet Port (RJ45))
footprint RJ45 - RJE3A1880402 (Ethernet Port (RJ45))
footprint RJ45 - RJE3A1880412 (Ethernet Port (RJ45))
pins: 1, 2, 3, 4, 5, 6, 7, 8, A1, A2, A3, A4, MH1, MH2

## SMA
designator J?
footprint SMA_angled
footprint SMA_edge
footprint SMA_solder
footprint SMA
pins: 1 SIG, 2 GND

## SNx4AHC02
designator U?, comment SN74AHC02DBR
Quadruple 2-Input Positive-Nor Gates
footprint SOP65P780X200-14N (SOP, 14-Leads, Body 6,20x5,30mm, Pitch 0,65mm, IPC Medium Density)
part A pins: 1 1Y (out), 2 1A (in), 3 1B (in)
part B pins: 4 2Y (out), 5 2A (in), 6 2B (in)
part C pins: 8 3A (in), 9 3B (in), 10 3Y (out)
part D pins: 11 4A (in), 12 4B (in), 13 4Y (out)
part E pins: 7 GND, 14 VDD

## THS4552
designator U?
Dual-Channel, Low-Noise, Precision, 150-MHz, Fully Differential Amplifier; Manufacturer_Name: Texas Instruments; Manufacturer_Part_Number: THS4552IRTWT; Datasheet Link: http://www.ti.com/lit/gpn/THS4552; Height: 0.8mm; Mouser2 Part Number: 595-THS4552IRTWT; Mouser2 Price/Stock: https://www.mouser.com/Search/Refine.aspx?Keyword=595-THS4552IRTWT
footprint QFN-24Pin_TP (QFN, 24-Leads, Body 4,00x4,00mm, Pitch 0,50mm, Thermal Pad 2,55x2,55mm, IPC Medium Density)
part A pins: 1 IN1- (in) "Negative Input Summing Node 1", 2 FB1+ (out) "Positive Output Feedback 1", 17 VOCM1 (power) "Output Common-Mode Voltage 1", 18 OUT1+ (out) "Positive Output 1", 19 OUT1- (out) "Negative Output 1", 20 ~{PD1} (in) "Power-Down Pin 1", 23 FB1- (out) "Negative Output Feedback 1", 24 IN1+ (in) "Positive Input Summing Node 1"
part B pins: 5 FB2- (out) "Negative Output Feedback 2", 6 IN2+ (in) "Positive Input Summing Node 2", 7 IN2- (in) "Negative Input Summing Node 2", 8 FB2+ (out) "Positive Output Feedback 2", 11 VOCM2 (power) "Output Common-Mode Voltage 2", 12 OUT2+ (out) "Positive Output 2", 13 OUT2- (out) "Negative Output 2", 14 ~{PD2} (in) "Power-Down Pin 2"
part C pins: 3 VS1+ (power) "Positive Supply Voltage 1", 4 VS1+ (power) "Positive Supply Voltage 1", 9 VS2+ (power) "Positive Supply Voltage 2", 10 VS2+ (power) "Positive Supply Voltage 2", 15 VS2- (power) "Negative Supply Voltage 2", 16 VS2- (power) "Negative Supply Voltage 2", 21 VS1- (power) "Negative Supply Voltage 1", 22 VS1- (power) "Negative Supply Voltage 1", 25 EP (power) "Connect the exposed pad to any plane between and including +VS and -VS."
part A text: Vocm
part B text: Vocm

## TXS0108EPWR
designator U?
8-Bit Bi-directional, Level-Shifting, Voltage Translator for Open-Drain and Push-Pull Applications
footprint TSSOP-20 (TSOP, 20-Leads, Body 6,50x4,35mm, Pitch 0,65mm, IPC Medium Density)
pins: 1 A1, 2 VCCA, 3 A2, 4 A3, 5 A4, 6 A5, 7 A6, 8 A7, 9 A8, 10 OE, 11 GND, 12 B8, 13 B7, 14 B6, 15 B5, 16 B4, 17 B3, 18 B2, 19 VCCB, 20 B1